# Altium footprint library MyPcbLib.PcbLib: 237 footprints (part 9 of 15)
Each footprint in its own frame and in the unit in brackets; x right, y up, seen from the top. Pads: shape width x height; smd on the part's side, far side on the other; paste and mask are expansions set on the pad; w line width, h text height; cw(c..) or ccw(c..) is an arc to the next point about the centre after c.
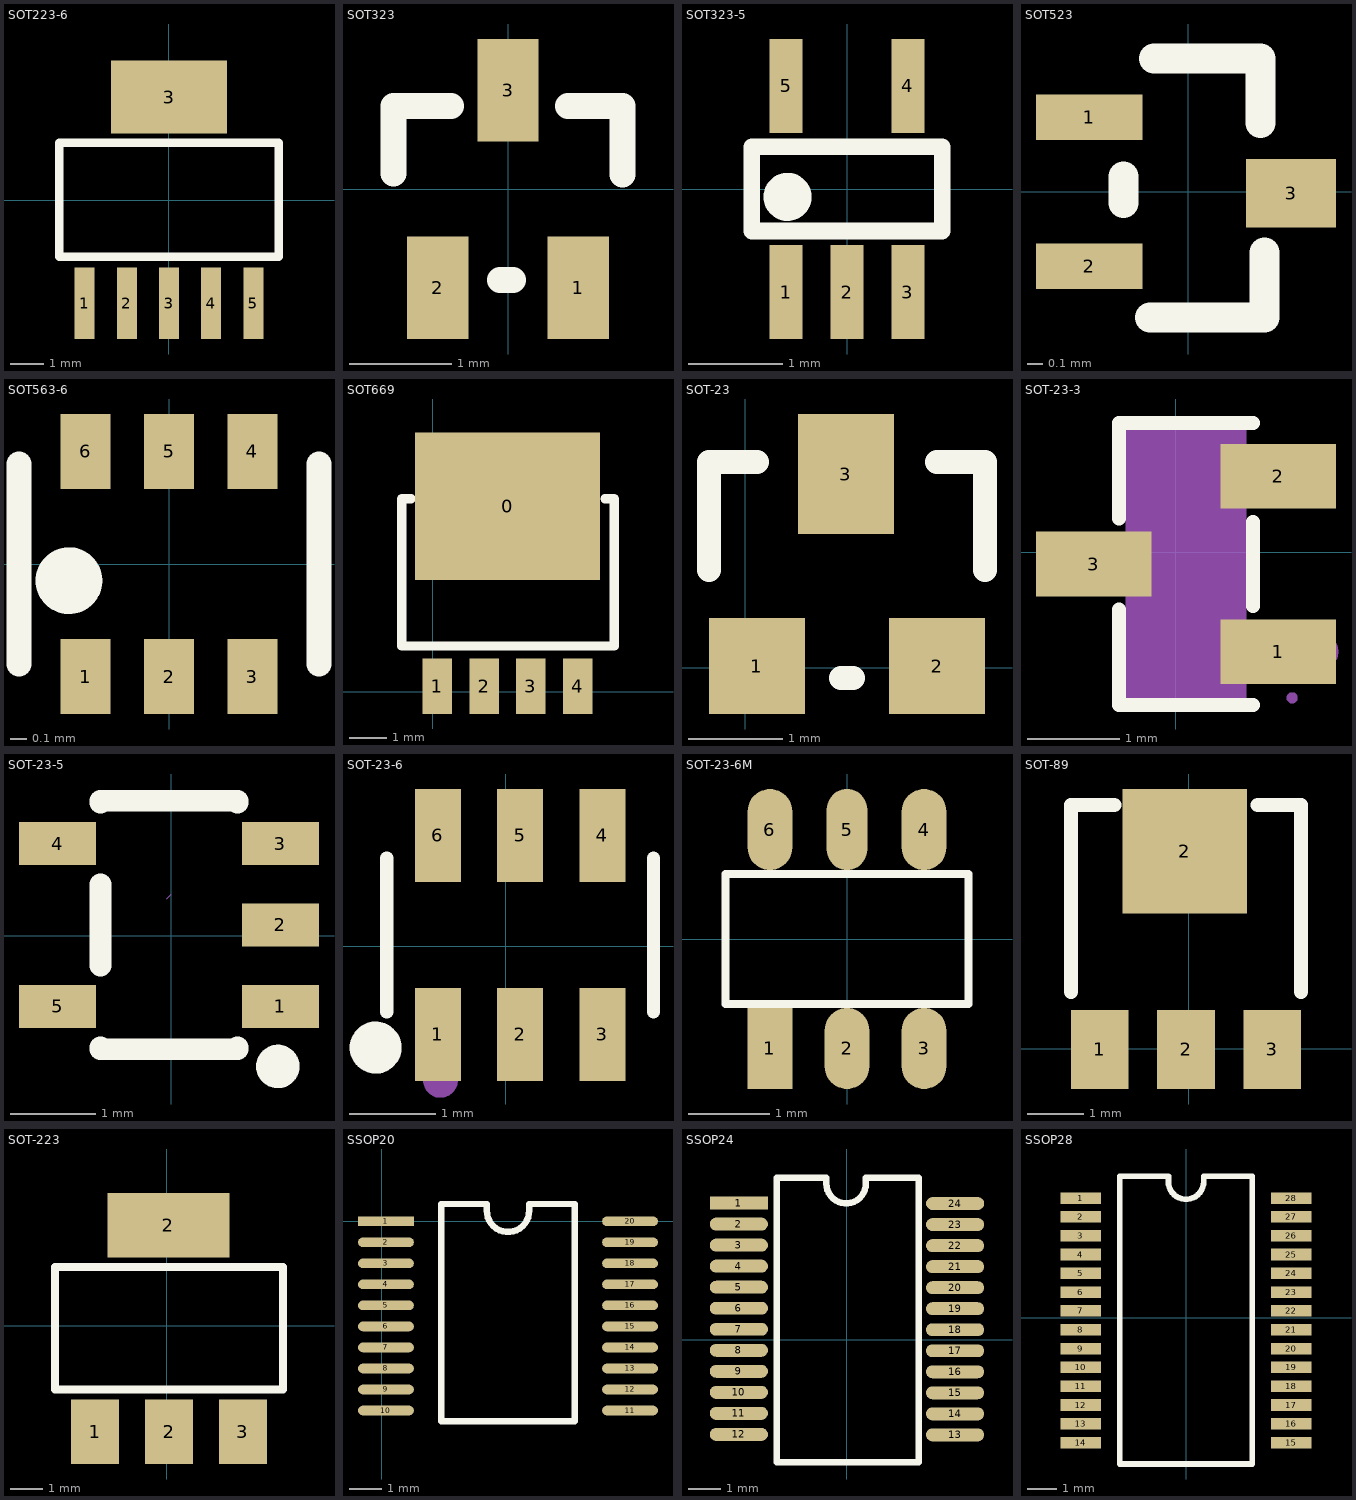
[diagram p8: the footprints below, top view; thin cyan lines are the x and y axes]

## SOT223-6 [mm]
pads (6):
  rect 0.6x2.15 smd: 1(-2.54,-3.1) 2(-1.27,-3.1) 3(0,-3.1) 4(1.27,-3.1) 5(2.54,-3.1)
  rect 3.5x2.2 smd: 3(0,3.1)
Top Overlay:
  lines w0.254: -3.3,-1.7 3.3,-1.7 3.3,1.73 -3.3,1.73 -3.3,-1.7
3D body "User Library-SOT223-6.STEP": height 1.9, standoff -0.17, extent -3.299,-3.681 3.251,3.579

## SOT323 [mm]
pads (3):
  rect 0.6x1 smd: 1(0.686,-0.965) 2(-0.686,-0.965) 3(0,0.965)
Top Overlay:
  lines w0.254: -1.118,0.152 -1.118,0.813 -0.559,0.813 ; -0.076,-0.889 0.051,-0.889 ; 0.584,0.813 1.118,0.813 1.118,0.143
3D body "SOT323 (SC70-3)-1.STEP": height 1.1, standoff 0, extent -1.092,-1.097 1.108,1.148

## SOT323-5 [mm] "SC70"
pads (5):
  rect 0.35x1 smd: 1(-0.65,-1.1) 2(0,-1.1) 3(0.65,-1.1) 4(0.65,1.1) 5(-0.65,1.1)
Top Overlay:
  circle w0.254: c-0.635,-0.084 r0.13
  lines w0.178: -1.016,-0.447 1.016,-0.447 1.016,0.449 -1.016,0.449 -1.016,-0.447
3D body "sot353.step": height 1, standoff 0, extent -1.05,-1.158 1.05,1.142

## SOT523 [mil]
pads (3):
  rect 28x12 smd: 1(-25.98,19.58) 2(-25.98,-19.58)
  rect 23.62x18 smd: 3(26.98,-0.46)
Top Overlay:
  lines w7.87: -17,-3 -17,4 ; -10,-33 20,-33 20,-16 ; -9,35 19,35 19,18
3D body "SOT-523.step": height 31.5, standoff 0, extent -32.5,-31.49 30.49,31.5

## SOT563-6 [mm]
pads (6):
  rect 0.3x0.45 smd: 1(-0.5,-0.675) 2(0,-0.675) 3(0.5,-0.675) 4(0.5,0.675) 5(0,0.675) 6(-0.5,0.675)
Top Overlay:
  circle w0.2: c-0.6,-0.1 r0.1
  lines w0.15: -0.9,-0.6 -0.9,0.6 ; 0.9,-0.6 0.9,0.6
3D body "SW3dPS-SOT-563.STEP": height 0.58, standoff 0, extent -0.8,-0.8 0.8,0.826

## SOT669 [mm] "IFPAK"
pads (5):
  rect 5x4 smd: 0(2.032,5.029)
  rect 0.8x1.5 smd: 1(0.127,0.152) 2(1.397,0.152) 3(2.667,0.152) 4(3.937,0.152)
Top Overlay:
  lines w0.254: -0.584,5.232 -0.838,5.232 -0.838,1.245 4.928,1.245 4.928,5.232 4.674,5.232
3D body "User Library-SOT669-CW.step": height 1.55, standoff 0.35, extent -0.418,-0.002 4.482,6.426

## SOT-23 [mil]
pads (3):
  rect 40x40 smd: 1(4.88,0.63) 2(79.88,0.63)
  rect 40x50 smd: 3(41.88,80.63)
Top Overlay:
  lines w10: -15.12,40.63 -15.12,85.63 4.88,85.63 ; 39.88,-4.37 44.88,-4.37 ; 79.88,85.63 99.88,85.63 99.88,40.63
3D body "SOT-23-3.STEP": height 47.24, standoff 0, extent -14.87,-11.02 99.3,99.22

## SOT-23-3 [mm]
pads (3):
  rect 1.25x0.7 smd: 1(1.111,-1.077) 2(1.111,0.823) 3(-0.889,-0.127)
Top Overlay:
  lines w0.152: -0.615,-0.622 -0.615,-1.653 0.837,-1.653 ; -0.615,0.368 -0.615,1.399 0.837,1.399 ; 0.837,-0.582 0.837,0.328
Mechanical 4:
  region: -0.539,-1.577 -0.539,1.323 0.761,1.323 0.761,-1.577
Mechanical 5:
  pour cut-out: -0.749,-0.342 -0.749,0.088 -0.529,0.088 -0.529,-0.342
  region: -0.739,-0.342 -0.739,0.088 -1.039,0.088 -1.039,-0.342
  pour cut-out: 0.751,0.608 0.751,1.038 0.971,1.038 0.971,0.608
  region: 0.961,0.608 0.961,1.038 1.261,1.038 1.261,0.608
  pour cut-out: 0.751,-1.292 0.751,-0.862 0.971,-0.862 0.971,-1.292
  region: 0.961,-1.292 0.961,-0.862 1.261,-0.862 1.261,-1.292
Mechanical 6:
  circle w0.06: c1.261,-1.577 r0.03
Mechanical 15:
  circle w0.2: c1.561,-1.077 r0.1

## SOT-23-5 [mm]
pads (5):
  rect 0.9x0.5 smd: 1(1.272,-0.823) 2(1.272,0.127) 3(1.272,1.077) 4(-1.328,1.077) 5(-1.328,-0.823)
Top Overlay:
  circle w0.254: c1.242,-1.524 r0.127
  lines w0.254: -0.828,-1.299 -0.828,-1.323 0.772,-1.323 0.772,-1.299 ; -0.828,-0.347 -0.828,0.601 ; -0.828,1.553 -0.828,1.577 0.772,1.577 0.772,1.553
Mechanical 15:
  lines w0.003: -0.053,0.432 -0.003,0.483

## SOT-23-6 [mm]
pads (6):
  rect 0.532x1.072 smd: 1(-0.783,-1.02) 2(0.167,-1.02) 3(1.117,-1.02) 4(1.117,1.278) 5(0.167,1.278) 6(-0.783,1.278)
Top Overlay:
  circle w0.3: c-1.501,-1.172 r0.15
  lines w0.152: -1.372,-0.76 -1.372,1.018 ; 1.707,-0.76 1.707,1.018
Mechanical 15:
  circle w0.2: c-0.753,-1.551 r0.1

## SOT-23-6M [mm]
pads (6):
  rect 0.55x1 smd: 1(-0.95,-1.35)
  oval 0.55x1 smd: 2(0,-1.35) 3(0.95,-1.35) 4(0.95,1.35) 6(-0.95,1.35)
  oval 0.5x1 smd: 5(0,1.35)
Top Overlay:
  lines w0.1: -1.5,-0.8 -1.5,0.8 1.5,0.8 1.5,-0.8 -1.5,-0.8
3D body "SOT-23-6-3.STEP": height 0.86, standoff 0, extent -1.5,-1.405 1.5,1.405

## SOT-89 [mil]
pads (4):
  rect 40x55 smd: 1(-61.82,-0.57) 2(-1.82,-0.57) 3(58.18,-0.57)
  rect 86.61x86.61 smd: 2(-2.76,137.22)
Top Overlay:
  lines w10: -81.82,39.43 -81.82,169.43 -51.82,169.43 ; 48.18,169.43 78.18,169.43 78.18,39.43
3D body "SOT-89.STEP": height 59.45, standoff 0, extent -90.07,-6.45 87.1,162.85

## SOT-223 [mil]
pads (4):
  rect 59x79 smd: 1(-88,-130) 2(2.55,-130) 3(93.1,-130)
  rect 150x79 smd: 2(1.88,123.54)
Top Overlay:
  lines w10: -137.45,-78 -137.45,72 142.55,72 142.55,-78 -137.45,-78
3D body "SOT-223_MP04A.STEP": height 66.93, standoff 0, extent -126.41,-138.72 129.5,135.3

## SSOP20 [mm]
pads (20):
  rect 1.727x0.3 smd: 1(0.127,0)
  oval 1.727x0.3 smd: 2(0.127,-0.65) 3(0.127,-1.3) 4(0.127,-1.95) 5(0.127,-2.6) 6(0.127,-3.25) 7(0.127,-3.9) 8(0.127,-4.55) 9(0.127,-5.2) 10(0.127,-5.85) 11(7.673,-5.85) 12(7.673,-5.2) 13(7.673,-4.55) 14(7.673,-3.9) 15(7.673,-3.25) 16(7.673,-2.6) 17(7.673,-1.95) 18(7.673,-1.3) 19(7.673,-0.65) 20(7.673,0)
Top Overlay:
  lines w0.2: 1.835,-6.175 5.965,-6.175 5.965,0.533 4.555,0.533 4.555,0.325 cw(c3.9,0.325) 3.245,0.325 3.245,0.533 1.835,0.533 1.835,-6.175
3D body "SSOP-20.STEP": height 1.79, standoff -0.05, extent -0.013,-6.52 7.887,0.78

## SSOP24 [mm]
pads (24):
  rect 1.8x0.4 smd: 1(-3.326,4.229)
  oval 1.8x0.4 smd: 2(-3.326,3.579) 3(-3.326,2.93) 4(-3.326,2.28) 5(-3.326,1.63) 6(-3.326,0.981) 7(-3.326,0.331) 8(-3.326,-0.319) 9(-3.326,-0.968) 10(-3.326,-1.618) 11(-3.326,-2.267) 12(-3.326,-2.917) 13(3.353,-2.932) 14(3.353,-2.282) 15(3.353,-1.632) 16(3.353,-0.983) 17(3.353,-0.333) 18(3.353,0.316) 19(3.353,0.966) 20(3.353,1.616) 21(3.353,2.265) 22(3.353,2.915) 23(3.353,3.565) 24(3.354,4.214)
Top Overlay:
  lines w0.2: -2.159,-3.785 2.235,-3.785 2.235,5.01 0.597,5.01 0.597,4.827 cw(c-0.013,4.827) -0.622,4.827 -0.622,5.01 -2.159,5.01 -2.159,-3.785
3D body "SSOP 24 PIN_.step": height 1.78, standoff -0.21, extent -3.924,-3.654 3.976,4.976

## SSOP28 [mil]
height 93.7
pads (28):
  rect 55x15.75 smd: 1(-142.95,162.5) 2(-142.95,136.92) 3(-142.95,111.34) 4(-142.95,85.77) 5(-142.95,60.19) 6(-142.95,34.61) 7(-142.95,9.04) 8(-142.95,-16.54) 9(-142.95,-42.12) 10(-142.95,-67.69) 11(-142.95,-93.27) 12(-142.95,-118.85) 13(-142.95,-144.42) 14(-143,-170) 15(142.95,-170) 16(142.95,-144.42) 17(142.95,-118.85) 18(142.95,-93.27) 19(142.95,-67.69) 20(142.95,-42.12) 21(142.95,-16.54) 22(142.95,9.04) 23(142.95,34.62) 24(142.95,60.19) 25(142.95,85.77) 26(142.95,111.35) 27(142.95,136.92) 28(142.95,162.5)
Top Overlay:
  lines w7.87: -90,-199 90,-199 90,192 23.99,192 23.99,184.8 cw(c0,184.8) -23.99,184.8 -23.99,192 -90,192 -90,-199
3D body "TSSOP28.STEP": height 41.34, standoff 0, extent -133.91,-196.91 125.93,188.92